# Altium footprint library CADTchip.PcbLib: 195 footprints (part 4 of 13)
Each footprint in its own frame and in the unit in brackets; x right, y up, seen from the top. Pads: shape width x height; smd on the part's side, far side on the other; paste and mask are expansions set on the pad; w line width, h text height; cw(c..) or ccw(c..) is an arc to the next point about the centre after c.
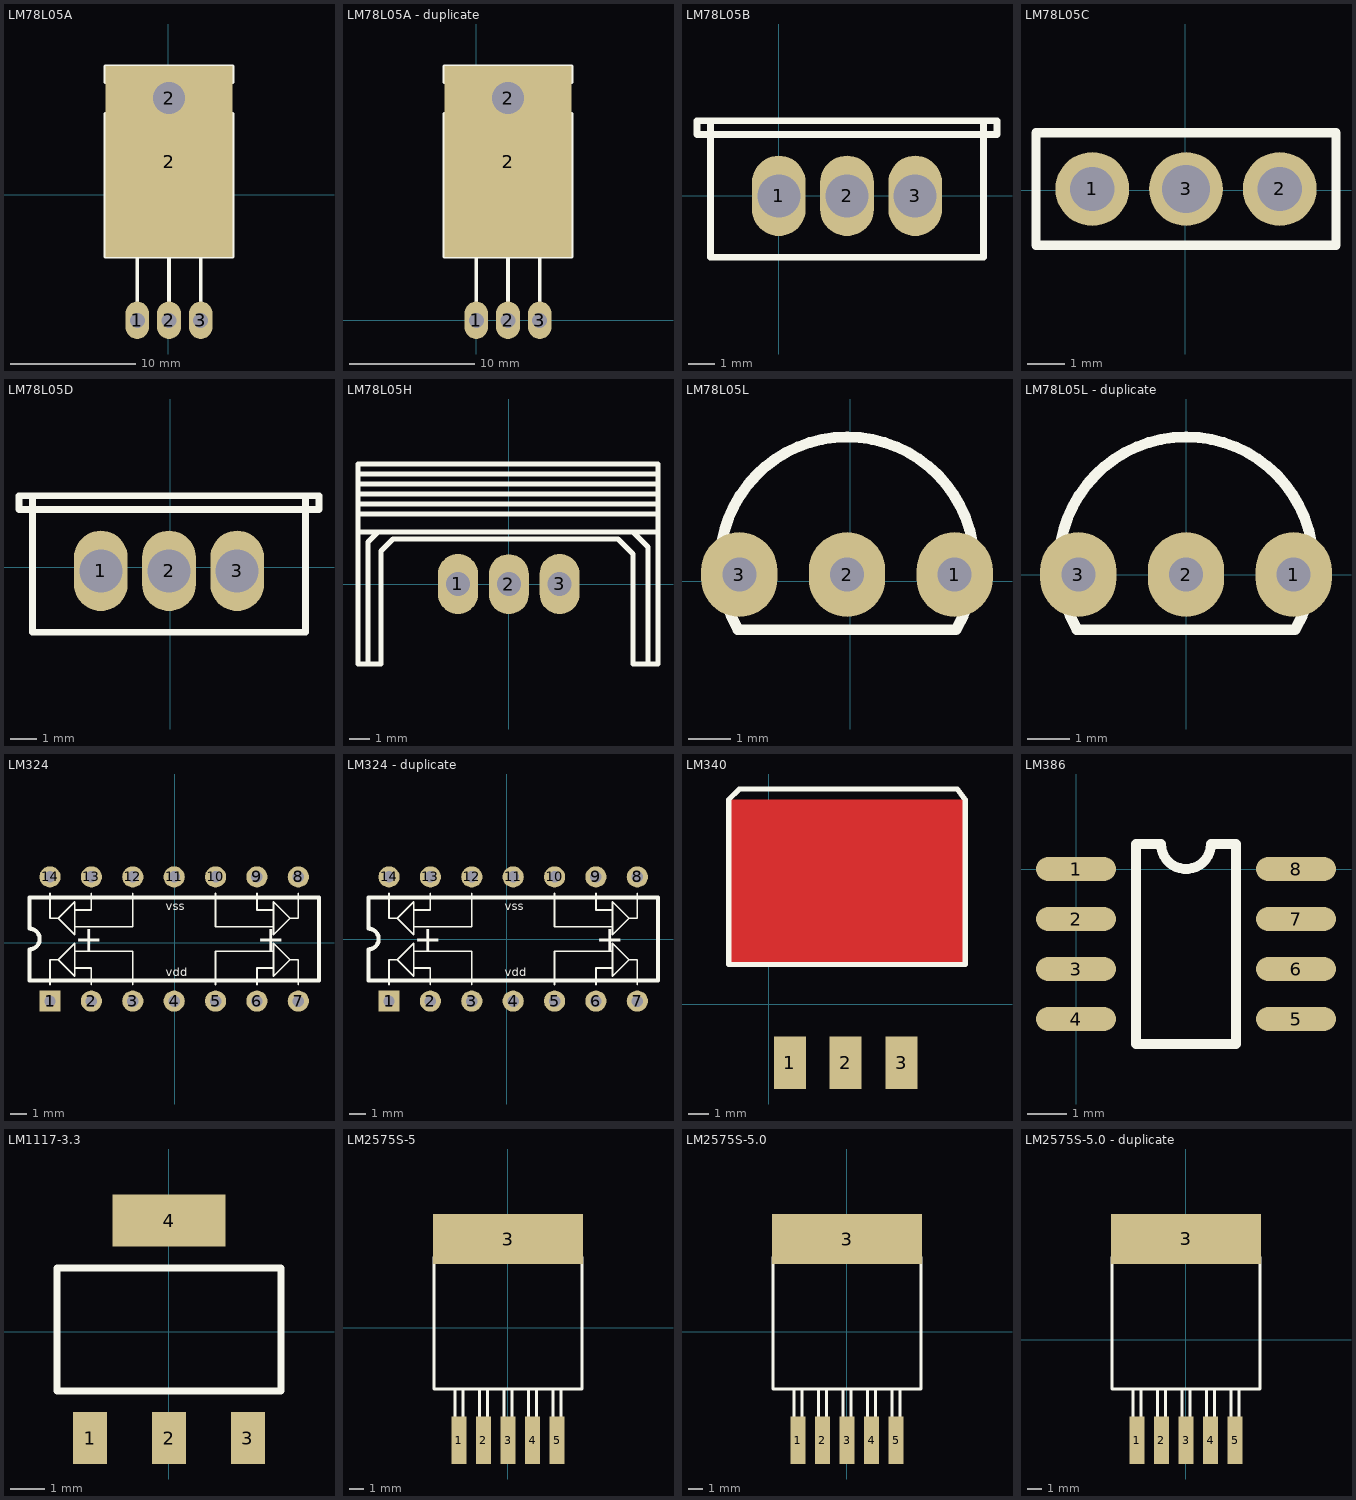
[diagram p3: the footprints below, top view; thin cyan lines are the x and y axes]

## LM78L05A [mm]
pads (5):
  oval 1.9x3 hole 1.2: 1(-2.499,-10.039) 2(0.041,-10.039) 3(2.581,-10.039)
  rect 10.2x15.3 smd: 2(0.041,2.661)
  round 3 hole 2.54: 2(0.041,7.741)
Top Overlay:
  lines w0.305: -2.499,-8.515 -2.499,-4.959 ; 0.041,-8.515 0.041,-4.959 ; 2.581,-8.515 2.581,-4.959 ; -5.039,-4.959 5.121,-4.959 5.121,6.471 3.851,6.471 3.851,9.011 5.121,9.011 5.121,10.281 -5.039,10.281 -5.039,9.011 -3.769,9.011 -3.769,6.471 -5.039,6.471 -5.039,-4.959

## LM78L05A - duplicate [mm]
pads (5):
  oval 1.9x3 hole 1.2: 1(0,0) 2(2.54,0) 3(5.08,0)
  rect 10.2x15.3 smd: 2(2.54,12.7)
  round 3 hole 2.54: 2(2.54,17.78)
Top Overlay:
  lines w0.305: 0,1.524 0,5.08 ; 2.54,1.524 2.54,5.08 ; 5.08,1.524 5.08,5.08 ; -2.54,5.08 -2.54,16.51 -1.27,16.51 -1.27,19.05 -2.54,19.05 -2.54,20.32 7.62,20.32 7.62,19.05 6.35,19.05 6.35,16.51 7.62,16.51 7.62,5.08 -2.54,5.08

## LM78L05B [mm]
pads (3):
  oval 2x3 hole 1.6: 1(0,0) 2(2.54,0) 3(5.08,0)
Top Overlay:
  lines w0.254: -2.54,2.794 7.62,2.794 ; -2.54,2.794 -2.54,-2.286 7.62,-2.286 7.62,2.794 ; -2.54,2.794 -3.048,2.794 -3.048,2.286 -2.54,2.286 7.62,2.286 8.128,2.286 8.128,2.794 7.62,2.794

## LM78L05C [mm]
pads (3):
  round 2 hole 1.2: 1(-2.524,0.033) 2(2.556,0.033)
  round 2 hole 1.3: 3(0.016,0.033)
Top Overlay:
  lines w0.254: -4.048,-1.491 4.08,-1.491 4.08,1.557 -4.048,1.557 -4.048,-1.491

## LM78L05D [mm]
pads (3):
  oval 2x3 hole 1.6: 1(-2.585,-0.135) 2(-0.045,-0.135) 3(2.495,-0.135)
Top Overlay:
  lines w0.254: -5.125,2.659 -5.633,2.659 -5.633,2.151 -5.125,2.151 5.035,2.151 5.543,2.151 5.543,2.659 5.035,2.659 ; -5.125,2.659 -5.125,-2.421 5.035,-2.421 5.035,2.659 ; -5.125,2.659 5.035,2.659

## LM78L05H [mm]
pads (3):
  oval 2x3 hole 1.2: 1(-2.544,0.006) 2(0,0) 3(2.536,0.006)
Top Overlay:
  lines w0.254: -7.544,2.61 7.456,2.61 ; -7.544,3.506 7.456,3.506 ; -7.544,4.006 7.456,4.006 ; -7.544,4.506 7.456,4.506 ; -7.544,5.006 7.456,5.006 ; -7.544,5.506 7.456,5.506 ; -7.044,-3.994 -7.044,2.11 -6.544,2.61 ; 6.206,2.61 6.956,1.86 6.956,-3.994 ; -7.544,-3.994 -7.544,6.006 7.456,6.006 7.456,-3.994 6.206,-3.994 6.206,1.506 5.456,2.256 -5.794,2.256 -6.392,1.658 -6.392,-3.994 -7.544,-3.994

## LM78L05L [mm]
pads (3):
  oval 1.8x2 hole 0.8: 1(2.462,0.154) 2(-0.078,0.154) 3(-2.618,0.154)
Top Overlay:
  lines w0.254: -2.672,-1.096 cw(c-0.074,0.404) 2.524,-1.096 ; -2.654,-1.146 2.496,-1.146

## LM78L05L - duplicate [mm]
pads (3):
  oval 1.8x2 hole 0.8: 1(2.54,0) 2(0,0) 3(-2.54,0)
Top Overlay:
  lines w0.254: -2.594,-1.25 cw(c0.004,0.25) 2.602,-1.25 ; -2.576,-1.3 2.574,-1.3

## LM324 [mm]
pads (14):
  rect 1.3x1.3 hole 0.7: 1(-7.651,-3.581)
  round 1.3 hole 0.7: 2(-5.111,-3.581) 3(-2.571,-3.581) 4(-0.031,-3.581) 5(2.509,-3.581) 6(5.049,-3.581) 7(7.589,-3.581) 8(7.589,4.039) 9(5.049,4.039) 10(2.509,4.039) 11(-0.031,4.039) 12(-2.571,4.039) 13(-5.111,4.039) 14(-7.651,4.039)
Top Overlay:
  lines w0.102: -7.651,-2.565 -7.651,-1.041 -7.143,-1.041 ; -7.651,3.023 -7.651,1.499 -7.143,1.499 ; -6.127,-1.549 -5.111,-1.549 -5.111,-2.565 ; -6.127,-0.533 -2.571,-0.533 -2.571,-2.565 ; -6.127,0.991 -2.571,0.991 -2.571,3.023 ; -6.127,2.007 -5.111,2.007 -5.111,3.023 ; 2.509,-2.565 2.509,-0.533 6.065,-0.533 ; 2.509,3.023 2.509,0.991 6.065,0.991 ; 5.049,-2.565 5.049,-1.549 6.065,-1.549 ; 5.049,3.023 5.049,2.007 6.065,2.007 ; 7.589,-2.565 7.589,-1.041 7.081,-1.041 ; 7.589,3.023 7.589,1.499 7.081,1.499 ; -7.143,-1.041 -6.127,-0.025 -6.127,-2.057 -7.143,-1.041 ; -7.143,1.499 -6.127,0.483 -6.127,2.515 -7.143,1.499 ; 7.081,-1.041 6.065,-0.025 6.065,-2.057 7.081,-1.041 ; 7.081,1.499 6.065,2.515 6.065,0.483 7.081,1.499
  lines w0.254: -8.921,-2.311 -8.921,-0.406 ccw(c-8.921,0.229) -8.921,0.864 -8.921,2.769 8.859,2.769 8.859,-2.311 -8.921,-2.311
  text "vdd" at -0.539,-2.057 h0.51
  text "vss" at -0.539,2.007 h0.51
  text "+" at -6.127,-0.533 h1.52
  text "+" at 5.049,-0.533 h1.52

## LM324 - duplicate [mm]
pads (14):
  rect 1.3x1.3 hole 0.7: 1(-7.239,-3.81)
  round 1.3 hole 0.7: 2(-4.699,-3.81) 3(-2.159,-3.81) 4(0.381,-3.81) 5(2.921,-3.81) 6(5.461,-3.81) 7(8.001,-3.81) 8(8.001,3.81) 9(5.461,3.81) 10(2.921,3.81) 11(0.381,3.81) 12(-2.159,3.81) 13(-4.699,3.81) 14(-7.239,3.81)
Top Overlay:
  lines w0.102: -7.239,-2.794 -7.239,-1.27 -6.731,-1.27 ; -7.239,2.794 -7.239,1.27 -6.731,1.27 ; -5.715,-1.778 -4.699,-1.778 -4.699,-2.794 ; -5.715,-0.762 -2.159,-0.762 -2.159,-2.794 ; -5.715,0.762 -2.159,0.762 -2.159,2.794 ; -5.715,1.778 -4.699,1.778 -4.699,2.794 ; 2.921,-2.794 2.921,-0.762 6.477,-0.762 ; 2.921,2.794 2.921,0.762 6.477,0.762 ; 5.461,-2.794 5.461,-1.778 6.477,-1.778 ; 5.461,2.794 5.461,1.778 6.477,1.778 ; 8.001,-2.794 8.001,-1.27 7.493,-1.27 ; 8.001,2.794 8.001,1.27 7.493,1.27 ; -6.731,-1.27 -5.715,-0.254 -5.715,-2.286 -6.731,-1.27 ; -6.731,1.27 -5.715,0.254 -5.715,2.286 -6.731,1.27 ; 7.493,-1.27 6.477,-0.254 6.477,-2.286 7.493,-1.27 ; 7.493,1.27 6.477,2.286 6.477,0.254 7.493,1.27
  lines w0.254: -8.509,-2.54 -8.509,-0.635 ccw(c-8.509,0) -8.509,0.635 -8.509,2.54 9.271,2.54 9.271,-2.54 -8.509,-2.54
  text "vdd" at -0.127,-2.286 h0.51
  text "vss" at -0.127,1.778 h0.51
  text "+" at -5.715,-0.762 h1.52
  text "+" at 5.461,-0.762 h1.52

## LM340 [mil]
pads (3):
  rect 60x98.43 smd: 1(40,-110) 2(145,-110) 3(250,-110)
Top Layer:
  rectangle: -80.02,75 374.98,385
Top Overlay:
  lines w10: -75,75 105,75 370,75 370,385 355,405 -55,405 -75,385 -75,75

## LM386 [mil] "SO-8P"
height 47.24
pads (8):
  oval 80x24 smd: 1(0,0) 2(0,-50) 3(0,-100) 4(0,-150) 5(220,-150) 6(220,-100) 7(220,-50) 8(220,0)
Top Overlay:
  lines w10: 60,-175 60,25 85,25 ccw(c110,25) 135,25 160,25 160,-175 60,-175

## LM1117-3.3 [mm]
pads (4):
  rect 0.99x1.5 smd: 1(-2.283,-3.085) 2(0.003,-3.085) 3(2.289,-3.085)
  rect 3.28x1.5 smd: 4(0.003,3.215)
Top Overlay:
  lines w0.2: -3.247,-1.715 3.253,-1.715 3.253,1.845 -3.247,1.845 -3.247,-1.715
3D body: height -0.38, standoff -2.08, extent -3.226,-3.429 3.274,3.531

## LM2575S-5 [mil]
pads (6):
  rect 40x130 smd: 1(-133.92,-307.32) 2(-66.92,-307.32) 3(0.08,-307.32) 4(67.08,-307.32) 5(134.08,-307.32)
  rect 410x137.79 smd: 3(0.08,242.68)
Top Overlay:
  lines w7.87: -144.42,-245.32 -144.42,-167.32 ; -123.42,-245.32 -123.42,-167.32 ; -77.42,-245.32 -77.42,-167.32 ; -56.42,-245.32 -56.42,-167.32 ; -10.42,-245.32 -10.42,-167.32 ; 10.58,-245.32 10.58,-167.32 ; 56.58,-245.32 56.58,-167.32 ; 77.58,-245.32 77.58,-167.32 ; 123.58,-245.32 123.58,-167.32 ; 144.58,-245.32 144.58,-167.32 ; -202.42,-167.32 202.58,-167.32 202.58,192.68 -202.42,192.68 -202.42,-167.32

## LM2575S-5.0 [mil]
pads (6):
  rect 40x130 smd: 1(-133.48,-296.84) 2(-66.48,-296.84) 3(0.52,-296.84) 4(67.52,-296.84) 5(134.52,-296.84)
  rect 410x137.79 smd: 3(0.52,253.16)
Top Overlay:
  lines w7.87: -143.98,-234.84 -143.98,-156.84 ; -122.98,-234.84 -122.98,-156.84 ; -76.98,-234.84 -76.98,-156.84 ; -55.98,-234.84 -55.98,-156.84 ; -9.98,-234.84 -9.98,-156.84 ; 11.02,-234.84 11.02,-156.84 ; 57.02,-234.84 57.02,-156.84 ; 78.02,-234.84 78.02,-156.84 ; 124.02,-234.84 124.02,-156.84 ; 145.02,-234.84 145.02,-156.84 ; -201.98,-156.84 203.02,-156.84 203.02,203.16 -201.98,203.16 -201.98,-156.84
3D body: height 176.56, standoff 0, extent -199.25,-297 203.25,268

## LM2575S-5.0 - duplicate [mil]
pads (6):
  rect 40x130 smd: 1(-134,-275) 2(-67,-275) 3(0,-275) 4(67,-275) 5(134,-275)
  rect 410x137.79 smd: 3(0,275)
Top Overlay:
  lines w7.87: -144.5,-213 -144.5,-135 ; -123.5,-213 -123.5,-135 ; -77.5,-213 -77.5,-135 ; -56.5,-213 -56.5,-135 ; -10.5,-213 -10.5,-135 ; 10.5,-213 10.5,-135 ; 56.5,-213 56.5,-135 ; 77.5,-213 77.5,-135 ; 123.5,-213 123.5,-135 ; 144.5,-213 144.5,-135 ; -202.5,-135 202.5,-135 202.5,225 -202.5,225 -202.5,-135